# Altium footprint library Kintex_SDR.PcbLib: 73 footprints (part 4 of 5)
Each footprint in its own frame and in the unit in brackets; x right, y up, seen from the top. Pads: shape width x height; smd on the part's side, far side on the other; paste and mask are expansions set on the pad; w line width, h text height; cw(c..) or ccw(c..) is an arc to the next point about the centre after c.
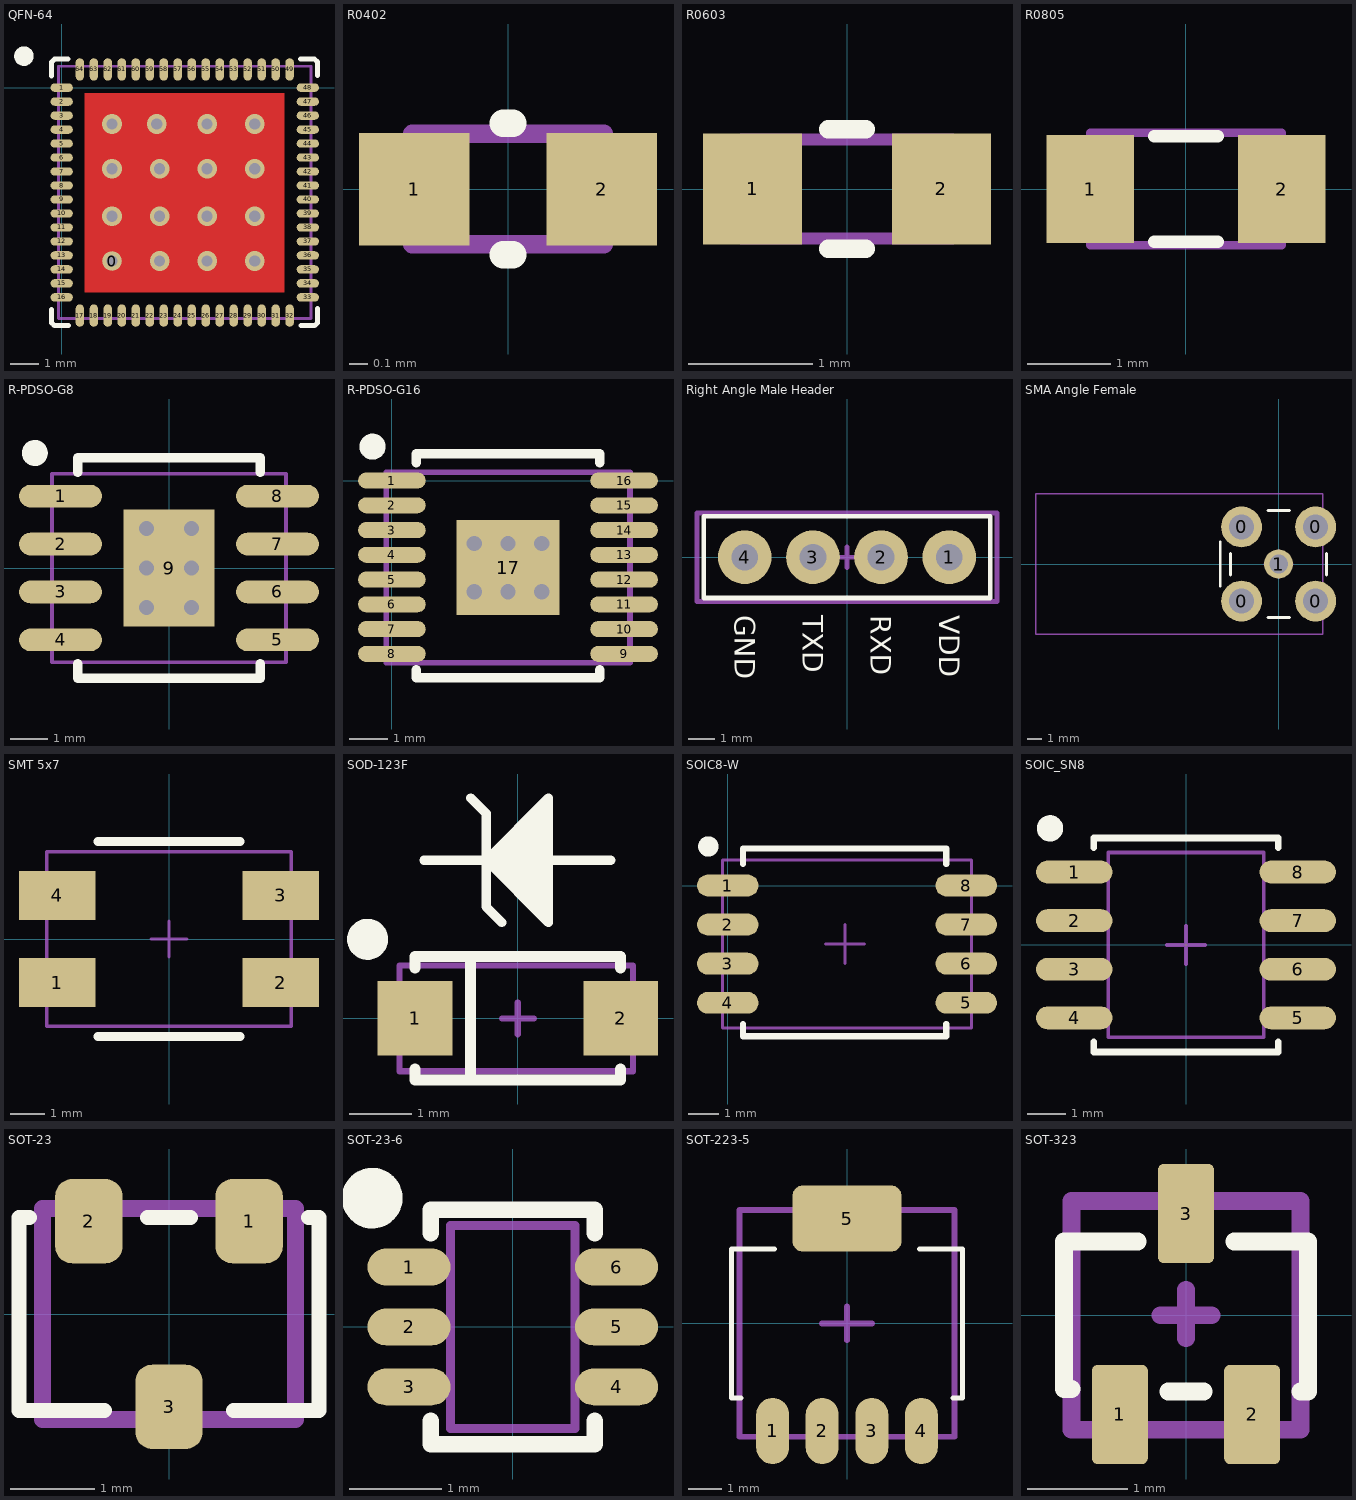
[diagram p3: the footprints below, top view; thin cyan lines are the x and y axes]

## QFN-64 [mm]
height 0.75
pads (65):
  round 0.7 hole 0.4: 0(1.8,-6.2)
  oval 0.8x0.3 smd: 1(0,0) 2(0,-0.5) 3(0,-1) 4(0,-1.5) 5(0,-2) 6(0,-2.5) 7(0,-3) 8(0,-3.5) 9(0,-4) 10(0,-4.5) 11(0,-5) 12(0,-5.5) 13(0,-6) 14(0,-6.5) 15(0,-7) 16(0,-7.5) 33(8.8,-7.5) 34(8.8,-7) 35(8.8,-6.5) 36(8.8,-6) 37(8.8,-5.5) 38(8.8,-5) 39(8.8,-4.5) 40(8.8,-4) 41(8.8,-3.5) 42(8.8,-3) 43(8.8,-2.5) 44(8.8,-2) 45(8.8,-1.5) 46(8.8,-1) 47(8.8,-0.5) 48(8.8,0)
  oval 0.3x0.8 smd: 17(0.65,-8.15) 18(1.15,-8.15) 19(1.65,-8.15) 20(2.15,-8.15) 21(2.65,-8.15) 22(3.15,-8.15) 23(3.65,-8.15) 24(4.15,-8.15) 25(4.65,-8.15) 26(5.15,-8.15) 27(5.65,-8.15) 28(6.15,-8.15) 29(6.65,-8.15) 30(7.15,-8.15) 31(7.65,-8.15) 32(8.15,-8.15) 49(8.15,0.65) 50(7.65,0.65) 51(7.15,0.65) 52(6.65,0.65) 53(6.15,0.65) 54(5.65,0.65) 55(5.15,0.65) 56(4.65,0.65) 57(4.15,0.65) 58(3.65,0.65) 59(3.15,0.65) 60(2.65,0.65) 61(2.15,0.65) 62(1.65,0.65) 63(1.15,0.65) 64(0.65,0.65)
via 5.2,-2.9 diameter 0.7 hole 0.4
via 3.5,-2.9 diameter 0.7 hole 0.4
via 3.4,-1.3 diameter 0.7 hole 0.4
via 1.8,-1.3 diameter 0.7 hole 0.4
via 1.8,-2.9 diameter 0.7 hole 0.4
via 5.2,-1.3 diameter 0.7 hole 0.4
via 6.9,-1.3 diameter 0.7 hole 0.4
via 6.9,-2.9 diameter 0.7 hole 0.4
via 3.5,-4.6 diameter 0.7 hole 0.4
via 1.8,-4.6 diameter 0.7 hole 0.4
via 3.5,-6.2 diameter 0.7 hole 0.4
via 5.2,-4.6 diameter 0.7 hole 0.4
via 6.9,-4.6 diameter 0.7 hole 0.4
via 5.2,-6.2 diameter 0.7 hole 0.4
via 6.9,-6.2 diameter 0.7 hole 0.4
Top Layer:
  rectangle: 0.825,-7.325 7.975,-0.2
Top Overlay:
  circle w0.35: c-1.35,1.125 r0.175
  lines w0.178: -0.356,-7.925 -0.356,-8.407 -0.254,-8.509 0.254,-8.509 ; -0.356,0.406 -0.356,0.914 -0.254,1.016 0.229,1.016 ; 8.534,1.016 9.042,1.016 9.144,0.914 9.144,0.432 ; 8.56,-8.509 9.042,-8.509 9.144,-8.407 9.144,-7.899
Top Paste:
  rectangle: 4.6,-7 7.6,-4
  rectangle: 1.1,-7 4.1,-4
  rectangle: 4.6,-3.5 7.6,-0.5
  rectangle: 1.1,-3.5 4.1,-0.5
Mechanical 1:
  lines w0.1: 3.81,-3.81 4.826,-3.81 ; 4.318,-4.318 4.318,-3.302 ; -0.11,-8.26 8.91,-8.26 8.91,0.76 -0.11,0.76 -0.11,-8.26
3D body "User Library-WQFN-64.step": height 0.8, standoff 0, extent -0.11,-8.26 8.91,0.76

## R0402 [mil]
height 12.6
pads (2):
  rect 23.62x24 smd: 1(-20,0) 2(20,0)
Top Overlay:
  lines w5.91: -1,-14 1,-14 ; -1,14 1,14
Mechanical 1:
  lines w3.94: -20.47,-11.8 20.48,-11.8 20.48,11.82 -20.47,11.82 -20.47,-11.8
3D body "User Library-0402R.step": height 13.39, standoff 0, extent -20.47,-11.8 20.48,11.82

## R0603 [mm]
height 1.3
pads (2):
  rect 0.8x0.9 smd: 1(-0.762,0) 2(0.762,0)
Top Overlay:
  lines w0.15: -0.152,-0.483 0.152,-0.483 ; -0.152,0.483 0.152,0.483
Mechanical 1:
  lines w0.1: -0.85,-0.4 -0.85,0.4 0.85,0.4 0.85,-0.4 -0.85,-0.4
3D body "User Library-RES-0603.step": height 0.56, standoff 0, extent -0.85,-0.4 0.85,0.4

## R0805 [mm]
height 0.5
pads (2):
  rect 1.05x1.3 smd: 1(-1.15,0) 2(1.15,0)
Top Overlay:
  lines w0.15: -0.381,-0.635 0.381,-0.635 ; -0.381,0.635 0.381,0.635
Mechanical 1:
  lines w0.1: -1.15,-0.675 1.15,-0.675 1.15,0.675 -1.15,0.675 -1.15,-0.675
3D body "User Library-RES-0805.step": height 0.76, standoff 0, extent -1.15,-0.675 1.15,0.675

## R-PDSO-G8 [mm] "PowerPAD PLASTIC SMALL OUTLINE"
height 1.7
pads (9):
  oval 2.2x0.6 smd: 1(-2.875,1.905) 2(-2.875,0.635) 3(-2.875,-0.635) 4(-2.875,-1.905) 5(2.875,-1.905) 6(2.875,-0.635) 7(2.875,0.635) 8(2.875,1.905)
  rect 2.4x3.1 all layers, no hole: 9(0,0)
via -0.6,1.05 diameter 0.7 hole 0.4
via 0.6,1.05 diameter 0.7 hole 0.4
via -0.6,0 diameter 0.7 hole 0.4
via 0.6,0 diameter 0.7 hole 0.4
via -0.6,-1.05 diameter 0.7 hole 0.4
via 0.6,-1.05 diameter 0.7 hole 0.4
Top Overlay:
  circle w0.35: c-3.556,3.048 r0.169
  lines w0.25: -2.413,-2.54 -2.413,-2.921 2.413,-2.921 2.413,-2.54 ; -2.413,2.54 -2.413,2.921 2.413,2.921 2.413,2.54
Top Paste:
  rectangle: -1.016,0.1 -0.1,1.397
  rectangle: 0.1,0.1 1.016,1.397
  rectangle: -1.016,-1.397 -0.1,-0.1
  rectangle: 0.1,-1.397 1.016,-0.1
Mechanical 1:
  lines w0.1: -3.1,-2.5 3.1,-2.5 3.1,2.5 -3.1,2.5 -3.1,-2.5
3D body "User Library-TPS54360DDA.step": height 1.58, standoff -0.01, extent -3.1,-2.5 3.1,2.5

## R-PDSO-G16 [mm]
height 3
pads (17):
  oval 1.78x0.42 smd: 1(0,0) 2(0,-0.65) 3(0,-1.3) 4(0,-1.95) 5(0,-2.6) 6(0,-3.25) 7(0,-3.9) 8(0,-4.55) 9(6.096,-4.55) 10(6.096,-3.9) 11(6.096,-3.25) 12(6.096,-2.6) 13(6.096,-1.95) 14(6.096,-1.3) 15(6.096,-0.65) 16(6.096,0)
  rect 2.7x2.5 all layers, no hole: 17(3.048,-2.286)
via 3.048,-2.921 diameter 0.7 hole 0.4
via 3.937,-2.921 diameter 0.7 hole 0.4
via 2.159,-2.921 diameter 0.7 hole 0.4
via 3.937,-1.651 diameter 0.7 hole 0.4
via 3.048,-1.651 diameter 0.7 hole 0.4
via 2.159,-1.651 diameter 0.7 hole 0.4
Top Overlay:
  circle w0.35: c-0.508,0.889 r0.167
  lines w0.25: 0.635,-4.973 0.635,-5.173 5.461,-5.173 5.461,-4.973 ; 0.635,0.473 0.635,0.698 5.461,0.698 5.461,0.473
Top Paste:
  rectangle: 1.905,-3.302 2.921,-2.413
  region: 4.191,-2.413 3.175,-2.413 3.175,-3.302 4.191,-3.302
  region: 4.191,-1.27 3.175,-1.27 3.175,-2.159 4.191,-2.159
  rectangle: 1.905,-2.159 2.921,-1.27
Mechanical 1:
  lines w0.15: 2.286,-2.286 3.81,-2.286 ; 3.048,-2.794 3.048,-1.778 ; -0.152,-4.786 -0.152,0.214 6.248,0.214 6.248,-4.786 -0.152,-4.786
3D body "User Library-TSSOP-16.step": height 1, standoff 0, extent -0.152,-4.786 6.248,0.214

## Right Angle Male Header [mm] "4-Way 2.54mm Right Angle Male Header"
height 3
pads (4):
  round 2 hole 1: 1(3.81,0) 2(1.27,0) 3(-1.27,0) 4(-3.81,0)
Top Overlay:
  lines w0.178: -5.334,-1.524 5.334,-1.524 5.334,1.524 -5.334,1.524 -5.334,-1.524
  text "VDD" at 3.429,-2.159 h0.76
  text "RXD" at 0.889,-2.159 h0.76
  text "TXD" at -1.651,-2.159 h0.76
  text "GND" at -4.191,-2.159 h0.76
Mechanical 1:
  lines w0.178: -0.508,0 0.508,0 ; 0,-0.381 0,0.381 ; -5.588,-1.651 5.588,-1.651 5.588,1.651 -5.588,1.651 -5.588,-1.651
3D body "User Library-Header_Male_RA_Low_4Pin.STEP": height 2.66, standoff -2.85, extent -5.08,-0.356 5.08,9.774

## SMA Angle Female [mm]
height 5
pads (5):
  round 2.8 hole 1.7: 0(-2.54,-2.54) 0(-2.54,2.54) 0(2.54,-2.54) 0(2.54,2.54)
  round 2 hole 1.27: 1(0,0)
Top Overlay:
  lines w0.2: -4,-1.5 -4,1.5 ; -3.302,-0.762 -3.302,0.718 ; -0.718,-3.683 0.762,-3.683 ; -0.718,3.683 0.762,3.683 ; 3.302,-0.762 3.302,0.718
Mechanical 1:
  lines w0.1: -1.016,0 1.016,0 ; 0,-1.016 0,1.016 ; -16.637,-4.826 -16.637,4.826 3.048,4.826 3.048,-4.826 -16.637,-4.826
3D body "732512201.stp": height 11.3, standoff -2.64, extent -16.553,-4.8 2.997,4.8

## SMT 5x7 [mm] "Quartz SMT 5x7"
height 1
pads (4):
  rect 2.2x1.4 smd: 1(-3.2,-1.25) 2(3.2,-1.25) 3(3.2,1.25) 4(-3.2,1.25)
Top Overlay:
  lines w0.254: -2.032,-2.794 2.032,-2.794 ; -2.032,2.794 2.032,2.794
Mechanical 1:
  lines w0.1: -0.508,0 0.508,0 ; 0,-0.508 0,0.508 ; -3.5,-2.5 -3.5,2.5 3.5,2.5 3.5,-2.5 -3.5,-2.5
3D body "User Library-GeyerElectronics_KX13.step": height 1.31, standoff 0, extent -3.5,-2.5 3.5,2.5

## SOD-123F [mm]
height 2
pads (2):
  rect 1.2x1.2 smd: 1(-1.651,0) 2(1.651,0)
Top Overlay:
  circle w0.35: c-2.413,1.27 r0.154
  region: 0.492,1.54 -0.508,2.54 0.492,3.54
  lines w0.15: -0.758,3.54 -0.508,3.29 -0.508,1.79 -0.258,1.54 ; 0.492,2.54 1.492,2.54 ; -1.508,2.54 -1.508,2.54 ; -1.508,2.54 -0.508,2.54 ; -0.508,2.54 -0.508,2.54 ; -0.508,2.54 0.492,1.54 0.492,3.54 -0.508,2.54
  lines w0.178: -1.651,-0.813 -1.651,-0.991 1.651,-0.991 1.651,-0.813 ; -1.651,0.813 -1.651,0.991 1.651,0.991 1.651,0.813 ; -0.762,-0.991 -0.762,0.991
Mechanical 1:
  lines w0.1: -0.254,0 0.254,0 ; 0,-0.254 0,0.254 ; -1.9,-0.85 1.85,-0.85 1.85,0.85 -1.9,0.85 -1.9,-0.85
3D body "User Library-SOD123F.step": height 1.2, standoff -0.01, extent -1.9,-0.85 1.85,0.85

## SOIC8-W [mil]
height 85.04
pads (8):
  oval 78.74x28 smd: 1(0,0) 2(0,-50) 3(0,-100) 4(0,-150) 5(305,-150) 6(305,-100) 7(305,-50) 8(305,0)
Top Overlay:
  circle w13.78: c-25,50 r6.07
  lines w7.87: 19.68,-177.17 19.68,-192.91 279.53,-192.91 279.53,-177.17 ; 19.68,27.56 19.68,47.24 279.53,47.24 279.53,27.56
Mechanical 1:
  lines w3.94: 125,-75 175,-75 ; 150,-100 150,-50 ; -6.95,-182.28 -6.95,32.68 312.02,32.68 312.02,-182.28 -6.95,-182.28
3D body "User Library-SOIC8_Wide_5mmx5mm.step": height 68.7, standoff -0.2, extent -6.95,-182.28 312.02,32.68

## SOIC_SN8 [mm]
pads (8):
  oval 2x0.6 smd: 1(-2.921,1.905) 2(-2.921,0.635) 3(-2.921,-0.635) 4(-2.921,-1.905) 5(2.921,-1.905) 6(2.921,-0.635) 7(2.921,0.635) 8(2.921,1.905)
Top Overlay:
  circle w0.35: c-3.556,3.048 r0.169
  lines w0.178: -2.413,-2.54 -2.413,-2.794 2.413,-2.794 2.413,-2.54 ; -2.413,2.54 -2.413,2.794 2.413,2.794 2.413,2.54
Mechanical 1:
  lines w0.1: -0.5,0 0.5,0 ; 0,-0.5 0,0.5 ; -2.032,-2.413 2.032,-2.413 2.032,2.413 -2.032,2.413 -2.032,-2.413
3D body "User Library-SOIC8_JEDEC_MS-012AA.step": height 1.75, standoff -0.01, extent -3.1,-2.5 3.1,2.5

## SOT-23 [mm]
height 1
pads (3):
  rrect50% 0.8x1 smd: 1(0.95,1.1) 2(-0.95,1.1) 3(0,-1.1)
Top Overlay:
  lines w0.178: -1.651,1.143 -1.778,1.143 -1.778,-1.143 -0.762,-1.143 ; -0.254,1.143 0.254,1.143 ; 0.762,-1.143 1.778,-1.143 1.778,1.143 1.651,1.143
Mechanical 1:
  lines w0.2: -1.5,-1.25 1.5,-1.25 1.5,1.25 -1.5,1.25 -1.5,-1.25
3D body "SOT23-3_TO-236AB.step": height 1.09, standoff 0, extent -1.5,-1.25 1.5,1.25

## SOT-23-6 [mm] "SOT23, 6-Leads"
height 1.1
pads (6):
  oval 0.9x0.4 smd: 1(-1.125,0.65) 2(-1.125,0) 3(-1.125,-0.65) 4(1.125,-0.65) 5(1.125,0) 6(1.125,0.65)
Top Overlay:
  circle w0.35: c-1.524,1.397 r0.154
  lines w0.178: -0.889,-1.016 -0.889,-1.27 0.889,-1.27 0.889,-1.016 ; -0.889,1.016 -0.889,1.27 0.889,1.27 0.889,1.016
Mechanical 1:
  lines w0.1: -0.675,-1.1 0.675,-1.1 0.675,1.1 -0.675,1.1 -0.675,-1.1
3D body "User Library-TSSOP-6 (SOT-23-6 PITCH 0_65).STEP": height 1.1, standoff -0.01, extent -1.125,-1.125 1.125,1.125

## SOT-223-5 [mm]
height 1.8
pads (5):
  oval 1x2 smd: 1(-2.25,-3.252) 2(-0.75,-3.252) 3(0.75,-3.252) 4(2.25,-3.252)
  rrect30% 3.3x2 smd: 5(0,3.175)
Top Overlay:
  lines w0.15: -3.2,-2.252 -3.5,-2.252 -3.5,2.248 -2.2,2.248 ; 2.2,2.248 3.5,2.248 3.5,-2.252 3.2,-2.252
Mechanical 1:
  lines w0.178: -0.762,0 0.762,0 ; 0,-0.508 0,0.508 ; -3.25,-3.429 3.25,-3.429 3.25,3.429 -3.25,3.429 -3.25,-3.429
3D body "User Library-User Library-SOT-223-5.step": height 1.63, standoff -0.02, extent -3.25,-3.5 3.25,3.5

## SOT-323 [mil]
height 39.37
pads (3):
  rrect20% 22x39 smd: 1(-26,-39) 2(26,-39) 3(0,40)
Top Overlay:
  lines w7: -45,-29 -48,-29 -48,29 -19,29 ; -7,-30 7,-30 ; 19,29 48,29 48,-30 45,-30
Mechanical 1:
  lines w7: -10,0 10,0 ; 0,-9 0,10 ; -45,-45 -45,45 45,45 45,-45 -45,-45
3D body "User Library-SOT323 (SC70-3)-1.STEP": height 43.31, standoff 0, extent -43.3,-44.19 43.31,44.2